# Altium footprint library STM32_Watch.PcbLib: 180 footprints (part 11 of 12)
Each footprint in its own frame and in the unit in brackets; x right, y up, seen from the top. Pads: shape width x height; smd on the part's side, far side on the other; paste and mask are expansions set on the pad; w line width, h text height; cw(c..) or ccw(c..) is an arc to the next point about the centre after c.
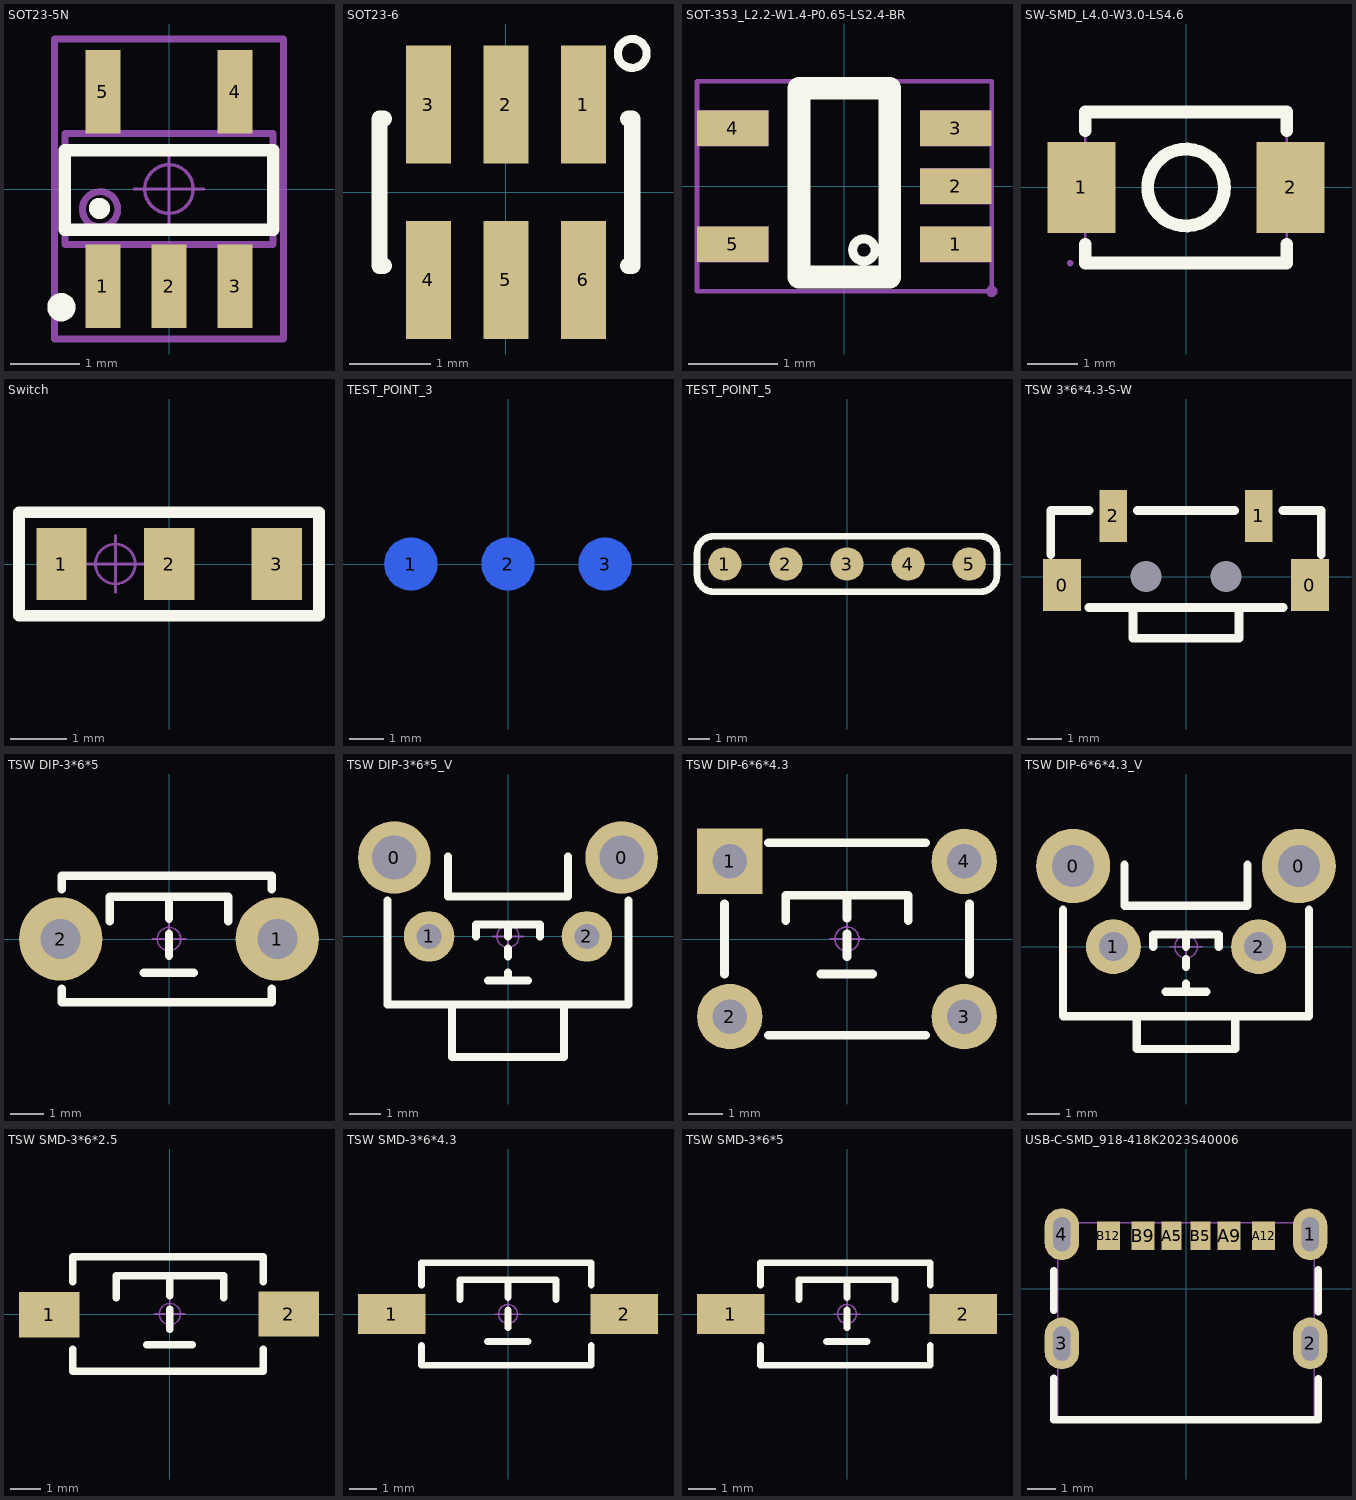
[diagram p10: the footprints below, top view; thin cyan lines are the x and y axes]

## SOT23-5N [mm] "3x1.6x1.1mm(长宽高)"
pads (5):
  rect 0.5x1.2 smd: 1(-0.95,-1.4) 2(0,-1.4) 3(0.95,-1.4) 4(0.95,1.4) 5(-0.95,1.4)
Top Overlay:
  circle w0.254: c-1.001,-0.279 r0.025
  circle w0.254: c-1.549,-1.702 r0.076
  lines w0.178: -1.5,-0.584 1.5,-0.584 1.5,0.559 -1.5,0.559 -1.5,-0.584
Mechanical 13:
  circle w0.1: c-0.992,-0.292 r0.254
  lines w0.1: -1.5,-0.8 1.5,-0.8 1.5,0.8 -1.5,0.8 -1.5,-0.8
Mechanical 15:
  circle w0.05: c0,0 r0.35
  lines w0.05: -0.5,0 0.5,0 ; 0,-0.5 0,0.5
  lines w0.1: -1.651,-2.159 -1.651,2.159 1.651,2.159 1.651,-2.159 -1.651,-2.159
3D body "SOT23-5.STEP": height 1.15, standoff -0.03, extent -1.5,-1.403 1.5,1.403

## SOT23-6 [mm] "SOT-23/SC-74A; 5 Leads; Body 3.1 x 3 mm, inc. leads (LxW max)"
height 1.45
pads (6):
  rect 0.55x1.45 smd: 1(0.95,1.075) 2(0,1.075) 3(-0.95,1.075) 4(-0.95,-1.075) 5(0,-1.075) 6(0.95,-1.075)
Top Overlay:
  circle w0.1: c1.549,1.702 r0.177
  lines w0.2: -1.5,-0.9 -1.55,-0.9 -1.55,0.9 -1.5,0.9 ; 1.5,-0.9 1.55,-0.9 1.55,0.9 1.5,0.9
3D body "sot236.step": height 1, standoff 0, extent -1.435,-1.195 1.485,1.145

## SOT-353_L2.2-W1.4-P0.65-LS2.4-BR [mm]
pads (5):
  rect 0.8x0.4 smd mask+0.051: 1(1.25,-0.65) 2(1.25,0) 3(1.25,0.65) 4(-1.25,0.65) 5(-1.25,-0.65)
Top Overlay:
  lines w0.1: 0.343,-0.714 cw(c0.218,-0.713) 0.343,-0.712
  lines w0.254: -0.508,-1.016 -0.508,1.1 0.508,1.1 0.508,-1.016 -0.508,-1.016
Mechanical 15:
  region: -0.85,-0.45 -0.85,-0.85 -1.65,-0.85 -1.65,-0.45
  region: -0.85,0.85 -0.85,0.45 -1.65,0.45 -1.65,0.85
  region: 1.65,0.85 1.65,0.45 0.85,0.45 0.85,0.85
  region: 1.65,0.2 1.65,-0.2 0.85,-0.2 0.85,0.2
  region: 1.65,-0.45 1.65,-0.85 0.85,-0.85 0.85,-0.45
  region: 1.71,-1.175 1.71,-1.15 1.675,-1.115 1.625,-1.115 1.59,-1.15 1.59,-1.175 1.59,-1.2 1.625,-1.235 1.675,-1.235 1.71,-1.2 1.71,-1.175
  lines w0.051: -1.65,-1.175 -1.65,1.175 1.65,1.175 1.65,-1.175 -1.65,-1.175
3D body "3D_PCB1_2023-02-10.step": height 1.25, standoff 0, extent -1.056,-0.999 1.056,0.999

## SW-SMD_L4.0-W3.0-LS4.6 [mm]
pads (2):
  rect 1.35x1.8 smd mask+0.051: 1(-2.075,0) 2(2.075,0)
Top Overlay:
  circle w0.254: c0,0 r0.762
  lines w0.254: -2,-1.131 -2,-1.5 2,-1.5 2,-1.131 ; -2,1.131 -2,1.5 2,1.5 2,1.131
Mechanical 15:
  region: 2.3,0.65 2.3,-0.65 1.8,-0.65 1.8,0.65
  region: -1.8,0.65 -1.8,-0.65 -2.3,-0.65 -2.3,0.65
  region: -2.24,-1.5 -2.24,-1.475 -2.275,-1.44 -2.325,-1.44 -2.36,-1.475 -2.36,-1.5 -2.36,-1.525 -2.325,-1.56 -2.275,-1.56 -2.24,-1.525 -2.24,-1.5
  lines w0.051: -2,-1.5 2,-1.5 2,1.5 -2,1.5 -2,-1.5
3D body "3D_PCB1_2023-02-18.step": height 2.02, standoff 0, extent -2.275,-1.476 2.275,1.524

## Switch [mil]
pads (3):
  rect 35x50 smd: 1(-74.8,0) 2(0,0) 3(74.8,0)
Top Overlay:
  lines w8: -104.33,-36 104.09,-36 104.1,35.98 -104.33,36 -104.33,-36
Mechanical 15:
  circle w1.97: c-37.4,0 r13.78
  lines w1.97: -57.08,0 -17.71,0 ; -37.4,-19.68 -37.4,19.69
3D body "R 0805.STEP": height 19.72, standoff -0.24, extent -76.76,-24.6 1.97,24.61

## TEST_POINT_3 [mil] "封装底层3个测试点"
pads (3):
  round 60 smd far side: 1(-110,0) 2(0,0) 3(110,0)
Bottom Overlay:
  lines w12: -170,-30 ccw(c-150,-30) -150,-50 150,-50 ccw(c150,-30) 170,-30 170,30 ccw(c150,30) 150,50 -150,50 ccw(c-150,30) -170,30 -170,-30

## TEST_POINT_5 [mil] "封装顶层5个测试点"
pads (5):
  round 60 smd: 1(-220,0) 2(-110,0) 3(0,0) 4(110,0) 5(220,0)
Top Overlay:
  lines w12: -270,-20 ccw(c-240,-20) -240,-50 240,-50 ccw(c240,-20) 270,-20 270,20 ccw(c240,20) 240,50 -240,50 ccw(c-240,20) -270,20 -270,-20

## TSW 3*6*4.3-S-W [mm] "侧立贴片3*6*4.3"
pads (6):
  rect 1.1x1.5 smd: 0(-3.575,-0.25) 0(3.575,-0.25)
  round 0 hole 0.9: 0(-1.15,0) 0(1.15,0)
  rect 0.8x1.5 smd: 1(2.1,1.75) 2(-2.1,1.75)
Top Overlay:
  lines w0.254: -3.9,0.635 -3.9,1.9 -3.895,1.905 -2.794,1.905 ; -2.794,-0.889 2.794,-0.889 ; -1.524,-0.889 -1.524,-1.778 1.524,-1.778 1.524,-0.889 ; -1.397,1.905 1.397,1.905 ; 2.794,1.905 3.895,1.905 3.9,1.91 3.9,0.635
3D body "TSW 3x6x4.3-S-W.STEP": height 3.51, standoff -0.74, extent -3.9,-1.79 3.9,1.91

## TSW DIP-3*6*5 [mm] "3*6*5mm"
pads (2):
  round 2.5 hole 1.2: 1(3.25,0) 2(-3.25,0)
Top Overlay:
  lines w0.254: -3.212,-1.499 -3.212,-1.9 3.088,-1.9 3.088,-1.499 ; -3.212,1.499 -3.212,1.9 3.088,1.9 3.088,1.499 ; -1.778,0.533 -1.778,1.27 1.778,1.27 1.778,0.533 ; -0.762,-1.016 0.737,-1.016 ; 0,-0.508 0,0.152 ; 0,0.61 0,1.27
Mechanical 15:
  circle w0.05: c0,0 r0.35
  lines w0.05: -0.5,0 0.5,0 ; 0,-0.5 0,0.5
3D body "TSW DIP-3x6x5.STEP": height 5.01, standoff -3.49, extent -3.914,-1.75 3.914,1.75

## TSW DIP-3*6*5_V [mm] "侧按轻触开关 3*6*5mm"
pads (4):
  round 2.3 hole 1.4: 0(-3.6,2.5) 0(3.6,2.5)
  round 1.6 hole 0.8: 1(-2.5,0) 2(2.5,0)
Top Overlay:
  lines w0.254: -3.81,1.143 -3.81,-2.159 3.81,-2.159 3.81,1.143 ; -1.905,2.54 -1.905,1.27 1.905,1.27 1.905,2.54 ; -1.778,-2.159 -1.778,-3.81 1.778,-3.81 1.778,-2.159 ; -1.016,0 -1.016,0.381 1.016,0.381 1.016,0 ; -0.635,-1.397 0.635,-1.397 ; 0,-1.397 0,-1.143 ; 0,-0.635 0,-0.381 ; 0,0 0,0.381
Mechanical 15:
  circle w0.05: c0,0 r0.35
  lines w0.05: -0.5,0 0.5,0 ; 0,-0.5 0,0.5
3D body "TSW DIP-3x6x5_V.STEP": height 4.45, standoff -2.8, extent -3.996,-3.75 3.996,3.5

## TSW DIP-6*6*4.3 [mm] "6*6*4.3mm"
pads (4):
  rect 1.9x1.9 hole 1: 1(-3.4,2.25)
  round 1.9 hole 1: 2(-3.4,-2.25) 3(3.4,-2.25) 4(3.4,2.25)
Top Overlay:
  lines w0.254: -3.556,-1.016 -3.556,1.016 ; -2.286,-2.794 2.286,-2.794 ; -2.286,2.794 2.286,2.794 ; -1.778,0.533 -1.778,1.27 1.778,1.27 1.778,0.533 ; -0.762,-1.016 0.737,-1.016 ; 0,-0.508 0,0.152 ; 0,0.61 0,1.27 ; 3.556,-1.016 3.556,1.016
Bottom Overlay:
  lines w0.254: -2.286,-2.286 2.286,-2.286 ; -2.286,2.286 2.286,2.286
Mechanical 15:
  circle w0.05: c0,0 r0.35
  lines w0.05: -0.5,0 0.5,0 ; 0,-0.5 0,0.5
3D body "TSW DIP-6x6x4.3.STEP": height 4.25, standoff -3.45, extent -4.106,-3 4.106,3

## TSW DIP-6*6*4.3_V [mm] "侧按轻触开关 6*6*4.3mm"
pads (4):
  round 2.3 hole 1.3: 0(-3.5,2.5) 0(3.5,2.5)
  round 1.7 hole 0.9: 1(-2.25,0) 2(2.25,0)
Top Overlay:
  lines w0.254: -3.81,1.143 -3.81,-2.159 3.81,-2.159 3.81,1.143 ; -1.905,2.54 -1.905,1.27 1.905,1.27 1.905,2.54 ; -1.524,-2.159 -1.524,-3.175 1.524,-3.175 1.524,-2.159 ; -1.016,0 -1.016,0.381 1.016,0.381 1.016,0 ; -0.635,-1.397 0.635,-1.397 ; 0,-1.397 0,-1.143 ; 0,-0.635 0,-0.381 ; 0,0 0,0.381
Mechanical 15:
  circle w0.05: c0,0 r0.35
  lines w0.05: -0.5,0 0.5,0 ; 0,-0.5 0,0.5
3D body "TSW DIP-6x6x4.3_V.STEP": height 7.47, standoff -3.4, extent -4.183,-3.023 4.184,4.127

## TSW SMD-3*6*2.5 [mm] "3*6*2.5mm"
pads (2):
  rect 2x1.5 smd: 1(-3.996,-0.02) 2(3.937,0)
Top Overlay:
  lines w0.254: -3.212,-1.168 -3.212,-1.9 3.088,-1.9 3.088,-1.168 ; -3.212,1.067 -3.212,1.9 3.088,1.9 3.088,1.067 ; -1.778,0.533 -1.778,1.27 1.778,1.27 1.778,0.533 ; -0.762,-1.016 0.737,-1.016 ; 0,-0.508 0,0.152 ; 0,0.61 0,1.27
Mechanical 15:
  circle w0.05: c0,0 r0.35
  lines w0.05: -0.5,0 0.5,0 ; 0,-0.5 0,0.5
3D body "TSW SMD-3x6x2.5.STEP": height 2.59, standoff -0.03, extent -4,-1.877 4,1.623

## TSW SMD-3*6*4.3 [mm] "3*6*4.3mm"
pads (2):
  rect 2.5x1.5 smd: 1(-4.318,0) 2(4.318,0)
Top Overlay:
  lines w0.254: -3.212,-1.168 -3.212,-1.9 3.088,-1.9 3.088,-1.168 ; -3.212,1.067 -3.212,1.9 3.088,1.9 3.088,1.067 ; -1.778,0.533 -1.778,1.27 1.778,1.27 1.778,0.533 ; -0.762,-1.016 0.737,-1.016 ; 0,-0.508 0,0.152 ; 0,0.61 0,1.27
Mechanical 15:
  circle w0.05: c0,0 r0.35
  lines w0.05: -0.5,0 0.5,0 ; 0,-0.5 0,0.5
3D body "TSW SMD-3x6x4.3.STEP": height 4.4, standoff -0.03, extent -4.6,-1.75 4.6,1.75

## TSW SMD-3*6*5 [mm] "3*6*5mm"
pads (2):
  rect 2.5x1.5 smd: 1(-4.318,0) 2(4.318,0)
Top Overlay:
  lines w0.254: -3.212,-1.168 -3.212,-1.9 3.088,-1.9 3.088,-1.168 ; -3.212,1.067 -3.212,1.9 3.088,1.9 3.088,1.067 ; -1.778,0.533 -1.778,1.27 1.778,1.27 1.778,0.533 ; -0.762,-1.016 0.737,-1.016 ; 0,-0.508 0,0.152 ; 0,0.61 0,1.27
Mechanical 15:
  circle w0.05: c0,0 r0.35
  lines w0.05: -0.5,0 0.5,0 ; 0,-0.5 0,0.5
3D body "TSW SMD-3x6x5.STEP": height 5.1, standoff -0.03, extent -4.6,-1.75 4.6,1.75

## USB-C-SMD_918-418K2023S40006 [mm]
pads (10):
  oval 1.2x1.8 hole 0.6 slot 1.2 at 90 deg mask+0.051: 1(4.32,1.9) 2(4.32,-1.9) 3(-4.32,-1.9) 4(-4.32,1.9)
  rect 0.7x1 smd mask+0.051: A5(-0.5,1.85) B5(0.5,1.85)
  rect 0.8x1 smd mask+0.051: A9(1.5,1.85) A12(2.7,1.85) B9(-1.5,1.85) B12(-2.7,1.85)
Top Overlay:
  lines w0.254: -4.6,-3.1 -4.6,-4.55 4.6,-4.55 4.6,-3.13 ; -4.6,-0.75 -4.6,0.63 ; 4.6,-0.8 4.6,0.66
Top Paste:
  region: -3.1,2.35 -2.3,2.35 -2.3,1.35 -3.1,1.35
  region: -1.9,2.35 -1.1,2.35 -1.1,1.35 -1.9,1.35
  region: -0.9,2.35 -0.1,2.35 -0.1,1.35 -0.9,1.35
  region: 0.1,2.35 0.9,2.35 0.9,1.35 0.1,1.35
  region: 1.1,2.35 1.9,2.35 1.9,1.35 1.1,1.35
  region: 2.3,2.35 3.1,2.35 3.1,1.35 2.3,1.35
  region: -3.82,1.5 -3.82,1.4 -3.896,1.217 -4.036,1.076 -4.22,1 -4.419,1 -4.603,1.076 -4.743,1.217 -4.82,1.4 -4.82,1.5 -4.82,2.3 -4.82,2.399 -4.743,2.583 -4.603,2.724 -4.419,2.8 -4.22,2.8 -4.036,2.724 -3.896,2.583 -3.82,2.399 -3.82,2.3
  region: -3.82,-2.3 -3.82,-2.4 -3.896,-2.583 -4.036,-2.724 -4.22,-2.8 -4.419,-2.8 -4.603,-2.724 -4.743,-2.583 -4.82,-2.4 -4.82,-2.3 -4.82,-1.5 -4.82,-1.401 -4.743,-1.217 -4.603,-1.076 -4.419,-1 -4.22,-1 -4.036,-1.076 -3.896,-1.217 -3.82,-1.401 -3.82,-1.5
  region: 4.82,-2.3 4.82,-2.4 4.744,-2.583 4.604,-2.724 4.42,-2.8 4.221,-2.8 4.037,-2.724 3.896,-2.583 3.82,-2.4 3.82,-2.3 3.82,-1.5 3.82,-1.401 3.896,-1.217 4.037,-1.076 4.221,-1 4.42,-1 4.604,-1.076 4.744,-1.217 4.82,-1.401 4.82,-1.5
  region: 4.82,1.5 4.82,1.4 4.744,1.217 4.604,1.076 4.42,1 4.221,1 4.037,1.076 3.896,1.217 3.82,1.4 3.82,1.5 3.82,2.3 3.82,2.399 3.896,2.583 4.037,2.724 4.221,2.8 4.42,2.8 4.604,2.724 4.744,2.583 4.82,2.399 4.82,2.3
Mechanical 6:
  circle w0.4: c2.7,1.89 r0.2
Mechanical 15:
  region: -4.17,2.3 -4.17,1.5 -4.47,1.5 -4.47,2.3
  region: 4.47,2.3 4.47,1.5 4.17,1.5 4.17,2.3
  region: -4.17,-1.5 -4.17,-2.3 -4.47,-2.3 -4.47,-1.5
  region: 4.47,-1.5 4.47,-2.3 4.17,-2.3 4.17,-1.5
  region: 2.4,2.15 3,2.15 3,1.55 2.4,1.55
  region: -3,2.15 -2.4,2.15 -2.4,1.55 -3,1.55
  region: 1.2,2.15 1.8,2.15 1.8,1.55 1.2,1.55
  region: -1.8,2.15 -1.2,2.15 -1.2,1.55 -1.8,1.55
  region: -0.75,2.15 -0.25,2.15 -0.25,1.55 -0.75,1.55
  region: 0.25,2.15 0.75,2.15 0.75,1.55 0.25,1.55
  region: 4.53,2.3 4.53,2.325 4.495,2.36 4.445,2.36 4.41,2.325 4.41,2.3 4.41,2.275 4.445,2.24 4.495,2.24 4.53,2.275 4.53,2.3
  lines w0.051: -4.47,-4.5 4.47,-4.5 4.47,2.3 -4.47,2.3 -4.47,-4.5
3D body "3D_PCB2_2023-04-24.step": height 3.16, standoff -1, extent -4.47,-4.514 4.47,2.286